# Altium footprint library 声源跟踪小车原封装库.PcbLib: 38 footprints (part 2 of 3)
Each footprint in its own frame and in the unit in brackets; x right, y up, seen from the top. Pads: shape width x height; smd on the part's side, far side on the other; paste and mask are expansions set on the pad; w line width, h text height; cw(c..) or ccw(c..) is an arc to the next point about the centre after c.
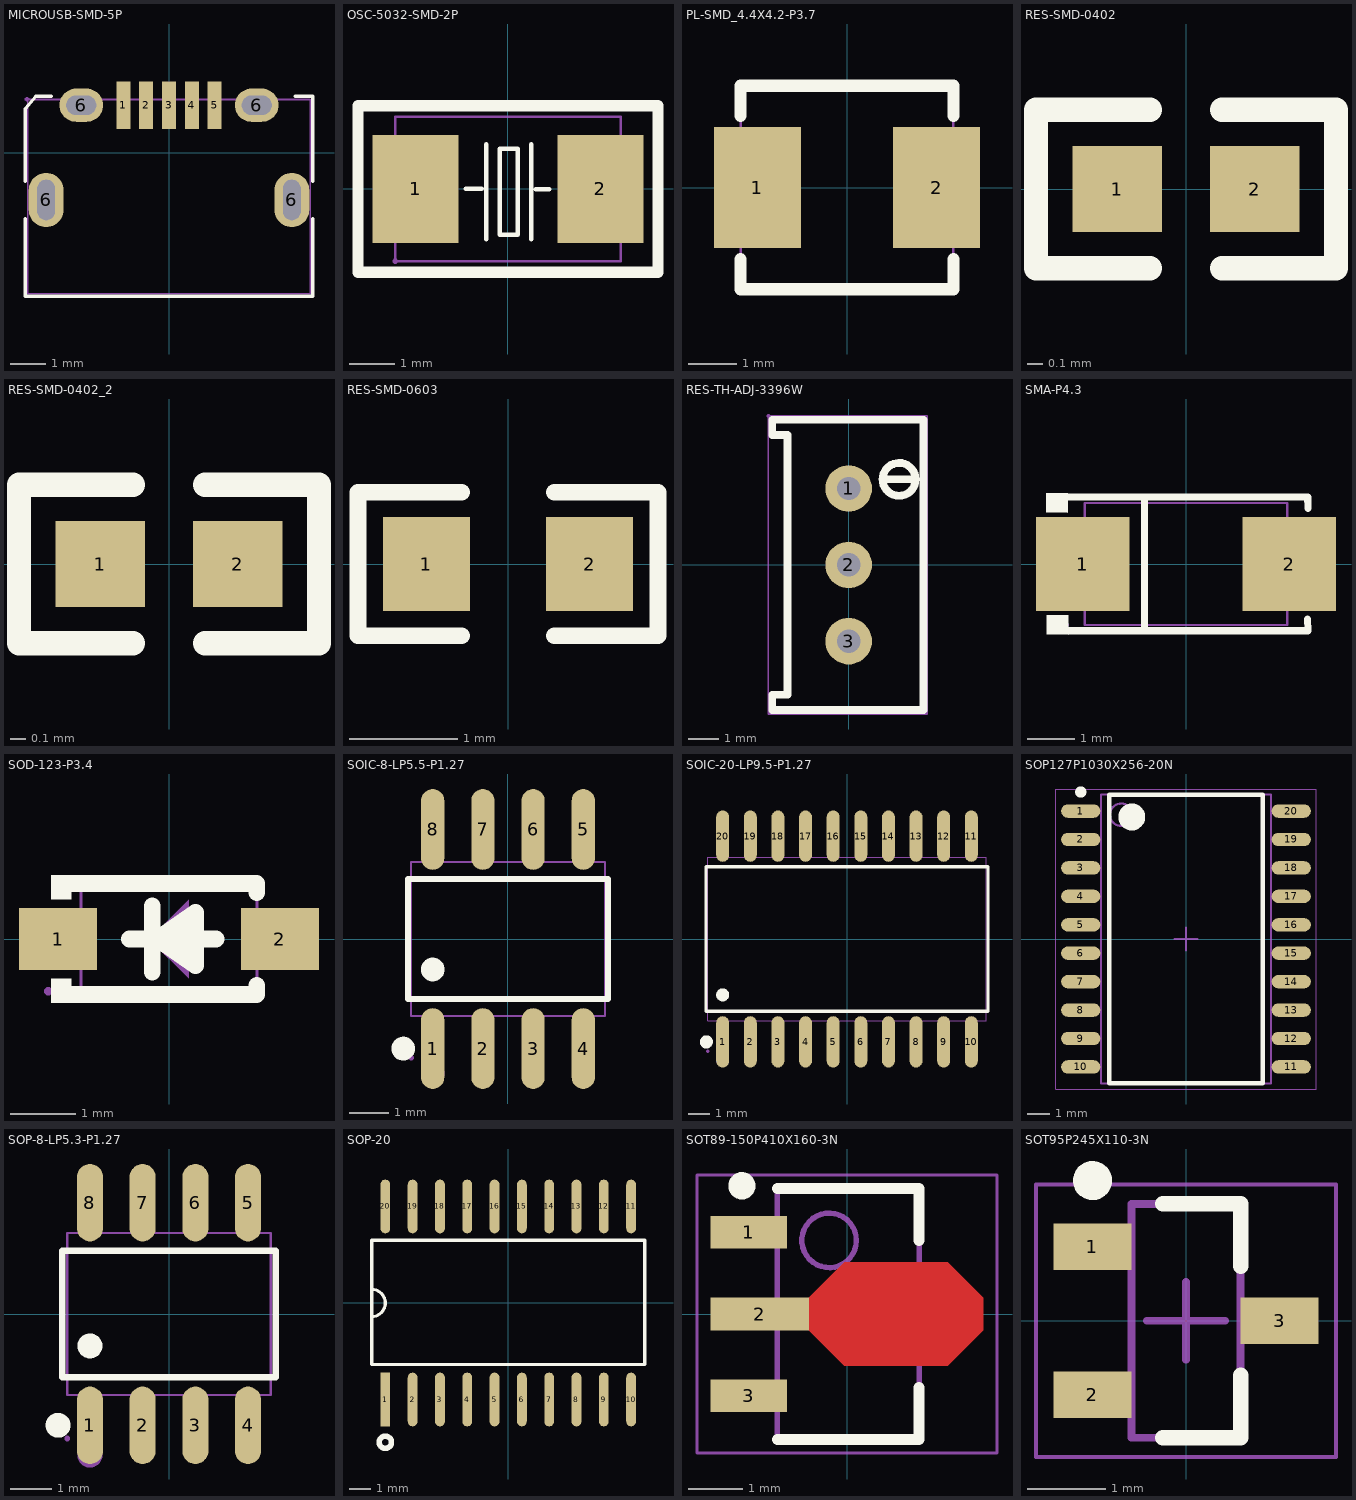
[diagram p1: the footprints below, top view; thin cyan lines are the x and y axes]

## MICROUSB-SMD-5P [mm] "MICRO-USB-5pin"
pads (9):
  rect 0.399x1.351 smd mask+0.051: 1(-1.3,1.35) 2(-0.65,1.35) 3(0,1.35) 4(0.65,1.35) 5(1.3,1.35)
  oval 1.001x1.549 hole 0.5 slot 1.151 at 90 deg mask+0.051: 6(-3.5,-1.35) 6(3.5,-1.35)
  oval 1.25x0.95 hole 0.551 slot 0.851 at 0 deg mask+0.051: 6(-2.499,1.35) 6(2.499,1.35)
Top Overlay:
  lines w0.099: -4.1,-1.883 -4.1,-3.55 -4.1,-4.101 -3.449,-4.101 3.81,-4.101 ; -4.1,-0.819 -4.1,0.951 -4.1,1.251 -3.8,1.599 -3.35,1.599 ; 3.599,1.599 4.1,1.599 4.1,0.9 4.1,-0.819 ; 3.701,-4.101 4.1,-4.101 4.1,-3.499 4.1,-1.883
Mechanical 2:
  region: -3.985,1.523 -3.985,1.548 -4.021,1.584 -4.071,1.584 -4.107,1.548 -4.107,1.523 -4.107,1.497 -4.071,1.462 -4.021,1.462 -3.985,1.497
  lines w0.051: -4.026,-4.022 4.026,-4.022 4.026,1.51 -4.026,1.51 -4.026,-4.022
3D body "Microusb-SMD-5P.step": height 2.73, standoff -0.6, extent -4,-3.893 4,1.637

## OSC-5032-SMD-2P [mm] "OSC-SMD_L5.0-W3.2"
pads (2):
  rect 1.9x2.4 smd mask+0.051: 1(-2.05,0) 2(2.05,0)
Top Overlay:
  lines w0.1: -0.94,0 -0.584,0 ; -0.483,-1.109 -0.483,0.991 ; 0.517,-1.109 0.517,0.991 ; 0.617,-0.009 0.917,-0.009 ; -0.183,-1.009 0.217,-1.009 0.217,0.89 -0.183,0.89 -0.183,-1.009
  lines w0.254: -3.325,-1.85 -3.325,-0.7 -3.325,0.7 -3.325,1.85 3.325,1.85 3.325,0.7 3.325,-0.7 3.325,-1.85 -3.325,-1.85
Mechanical 2:
  region: -2.44,-1.6 -2.44,-1.575 -2.475,-1.54 -2.525,-1.54 -2.56,-1.575 -2.56,-1.6 -2.56,-1.625 -2.525,-1.66 -2.475,-1.66 -2.44,-1.625
  region: -1.2,1 -1.2,-1 -2.5,-1 -2.5,1
  region: 2.5,1 2.5,-1 1.2,-1 1.2,1
  lines w0.051: -2.5,-1.6 2.5,-1.6 2.5,1.6 -2.5,1.6 -2.5,-1.6
3D body "OSC-5032-SMD-2P.step": height 1.42, standoff 0, extent -2.5,-1.6 2.5,1.6

## PL-SMD_4.4X4.2-P3.7 [mm] "IND-SMD_L4.4-W4.2_YXMAA0412"
pads (2):
  rect 1.801x2.499 smd mask+0.051: 1(-1.849,0) 2(1.849,0)
Top Overlay:
  lines w0.254: -2.2,-1.481 -2.2,-2.101 2.2,-2.101 2.2,-1.481 ; -2.2,1.481 -2.2,2.101 2.2,2.101 2.2,1.481
Mechanical 2:
  region: -2.139,-2.101 -2.139,-2.075 -2.174,-2.04 -2.225,-2.04 -2.261,-2.075 -2.261,-2.101 -2.261,-2.126 -2.225,-2.162 -2.174,-2.162 -2.139,-2.126
  region: -2.2,0.749 -1.4,0.749 -1.4,-0.749 -2.2,-0.749
  region: 1.4,0.749 2.2,0.749 2.2,-0.749 1.4,-0.749
  lines w0.051: -2.2,-2.101 -2.2,2.101 2.2,2.101 2.2,-2.101 -2.2,-2.101
3D body "PL-SMD_4.4X4.2-P3.7.step": height 1.21, standoff 0, extent -2.2,-2.101 2.2,2.099

## RES-SMD-0402 [mm] "贴片电阻0402"
pads (2):
  rect 0.566x0.54 smd: 1(-0.433,0) 2(0.433,0)
Top Overlay:
  lines w0.152: -0.226,-0.499 -0.944,-0.499 -0.944,0.499 -0.226,0.499 ; 0.226,-0.499 0.944,-0.499 0.944,0.499 0.226,0.499
Top Paste:
  region: 0.135,-0.23 0.135,0.23 0.175,0.27 0.676,0.27 0.716,0.23 0.716,-0.23 0.676,-0.27 0.175,-0.27
  region: -0.135,-0.23 -0.135,0.23 -0.175,0.27 -0.676,0.27 -0.716,0.23 -0.716,-0.23 -0.676,-0.27 -0.175,-0.27
3D body "RES-SMD-0402.step": height 0.5, standoff 0, extent -0.5,-0.25 0.5,0.25

## RES-SMD-0402_2 [mm]
pads (2):
  rect 0.566x0.54 smd: 1(-0.433,0) 2(0.433,0)
Top Overlay:
  lines w0.152: -0.226,-0.499 -0.944,-0.499 -0.944,0.499 -0.226,0.499 ; 0.226,-0.499 0.944,-0.499 0.944,0.499 0.226,0.499
Top Paste:
  region: 0.135,-0.23 0.135,0.23 0.175,0.27 0.676,0.27 0.716,0.23 0.716,-0.23 0.676,-0.27 0.175,-0.27
  region: -0.135,-0.23 -0.135,0.23 -0.175,0.27 -0.676,0.27 -0.716,0.23 -0.716,-0.23 -0.676,-0.27 -0.175,-0.27
3D body "RES-SMD-0402.step": height 0.5, standoff 0, extent -0.5,-0.25 0.5,0.25

## RES-SMD-0603 [mm] "贴片电阻0603"
pads (2):
  rect 0.806x0.864 smd: 1(-0.753,0) 2(0.753,0)
Top Overlay:
  lines w0.152: -0.426,-0.661 -1.385,-0.661 -1.385,0.661 -0.426,0.661 ; 0.426,-0.661 1.385,-0.661 1.385,0.661 0.426,0.661
Top Paste:
  region: 1.195,0.45 0.395,0.45 0.345,0.4 0.345,0.172 0.715,0.172 0.715,-0.158 0.345,-0.158 0.345,-0.4 0.395,-0.45 1.195,-0.45 1.245,-0.4 1.245,0.4
  region: -0.355,0.4 -0.355,0.172 -0.735,0.172 -0.735,-0.158 -0.355,-0.158 -0.355,-0.4 -0.405,-0.45 -1.195,-0.45 -1.245,-0.4 -1.245,0.4 -1.195,0.45 -0.405,0.45
3D body "RES-SMD-0603.step": height 0.78, standoff -0.02, extent -0.8,-0.4 0.8,0.4

## RES-TH-ADJ-3396W [mil] "RES-ADJ-TH_3P-L10.0-W10.0-P2.50-BL-BS"
pads (3):
  round 60 hole 30 mask+2: 1(0,98.4) 2(0,0) 3(0,-98.4)
Top Overlay:
  lines w10: 50,110.4 65,110.4 ; 86.2,109.99 cw(c64.98,110.19) 86.2,110.4 ; 96.5,-187.2 -96.5,-187.2 -98.4,-187.2 -98.4,-167.5 -78.7,-167.5 -78.7,167.5 -98.4,167.5 -98.4,187 -96.5,187 96.5,187 96.5,-187 ; 65,110.4 80,110.4 65,110.4
Mechanical 1:
  region: -101,192 -101,192.99 -102.41,194.4 -104.39,194.4 -105.8,192.99 -105.8,192 -105.8,191.01 -104.39,189.6 -102.41,189.6 -101,191.01
  region: 11.1,-98.4 11.1,-96.19 9.41,-92.11 6.29,-88.99 2.21,-87.3 -2.21,-87.3 -6.29,-88.99 -9.41,-92.11 -11.1,-96.19 -11.1,-98.4 -11.1,-100.61 -9.41,-104.69 -6.29,-107.81 -2.21,-109.5 2.21,-109.5 6.29,-107.81 9.41,-104.69 11.1,-100.61
  region: 11.1,98.4 11.1,100.61 9.41,104.69 6.29,107.81 2.21,109.5 -2.21,109.5 -6.29,107.81 -9.41,104.69 -11.1,100.61 -11.1,98.4 -11.1,96.19 -9.41,92.11 -6.29,88.99 -2.21,87.3 2.21,87.3 6.29,88.99 9.41,92.11 11.1,96.19
  region: 11.1,0 11.1,2.21 9.41,6.29 6.29,9.41 2.21,11.1 -2.21,11.1 -6.29,9.41 -9.41,6.29 -11.1,2.21 -11.1,0 -11.1,-2.21 -9.41,-6.29 -6.29,-9.41 -2.21,-11.1 2.21,-11.1 6.29,-9.41 9.41,-6.29 11.1,-2.21
  lines w2: -103.4,-192.2 -103.4,192 101.5,192 101.5,-192.2 -103.4,-192.2
3D body "RES-TH-ADJ-3396W.step": height 453.72, standoff -136.81, extent -94.48,-187 96.45,187

## SMA-P4.3 [mm] "SMA_L4.3-W2.6-LS5.1-RD"
pads (2):
  rect 1.999x1.999 smd mask+0.051: 1(-2.2,0) 2(2.2,0)
Top Overlay:
  region: -2.512,-1.095 -2.512,-1.504 -2.972,-1.499 -2.969,-1.095
  region: -2.52,1.504 -2.522,1.095 -2.982,1.1 -2.977,1.504
  lines w0.152: -2.596,-1.425 2.596,-1.425 ; -2.596,1.427 2.596,1.427 2.603,1.186 ; -0.884,-1.425 -0.884,1.427 ; 2.593,-1.176 2.601,-1.415
Mechanical 2:
  region: -1.435,0.724 -1.435,-0.724 -2.56,-0.724 -2.56,0.724
  region: 2.56,0.724 2.56,-0.724 1.435,-0.724 1.435,0.724
  region: -2.499,-1.3 -2.499,-1.275 -2.535,-1.24 -2.586,-1.24 -2.621,-1.275 -2.621,-1.3 -2.621,-1.326 -2.586,-1.361 -2.535,-1.361 -2.499,-1.326
  lines w0.051: -2.159,-1.3 -2.159,1.3 2.159,1.3 2.159,-1.3 -2.159,-1.3
3D body "SMA-P4.3.step": height 2.13, standoff 0.03, extent -2.496,-1.3 2.496,1.3

## SOD-123-P3.4 [mm] "SOD-123_L2.7-W1.6-LS3.7-RD-1"
pads (2):
  rect 1.199x0.95 smd mask+0.051: 1(-1.699,0) 2(1.699,0)
Top Overlay:
  region: 0.406,-0.406 0.406,0.406 -0.178,0
  region: -1.501,0.978 -1.501,0.607 -1.806,0.607 -1.806,0.978
  region: -1.501,-0.978 -1.501,-0.607 -1.806,-0.607 -1.806,-0.978
  lines w0.254: -1.643,0.848 -1.643,0.851 -1.346,0.851 1.346,0.851 1.346,0.706 ; -1.638,-0.848 -1.638,-0.851 -1.346,-0.851 1.346,-0.851 1.346,-0.706 ; -0.61,0 -0.279,0 ; -0.254,-0.508 -0.254,0.508 ; 0.406,0 0.721,0 ; -0.178,0 0.406,0.406 0.406,-0.406 -0.178,0
Mechanical 2:
  region: -1.509,-0.274 -1.509,0.274 -1.341,0.274 -1.341,-0.274
  region: -1.849,-0.274 -1.849,0.274 -1.501,0.274 -1.501,-0.274
  region: 1.341,-0.274 1.341,0.274 1.509,0.274 1.509,-0.274
  region: 1.501,-0.274 1.501,0.274 1.849,0.274 1.849,-0.274
  region: -0.3,0 0.3,-0.599 0.3,0.599
  region: -1.788,-0.8 -1.788,-0.775 -1.824,-0.739 -1.874,-0.739 -1.91,-0.775 -1.91,-0.8 -1.91,-0.825 -1.874,-0.861 -1.824,-0.861 -1.788,-0.825
  lines w0.051: -1.349,-0.8 -1.349,0.8 1.349,0.8 1.349,-0.8 -1.349,-0.8
3D body "SOD-123-P3.4.step": height 1.2, standoff 0, extent -1.85,-0.8 1.85,0.8

## SOIC-8-LP5.5-P1.27 [mil] "SOIC-8_L4.9-W3.9-P1.27-LS6.0-BL"
pads (8):
  oval 23.2x80.5 smd mask+2: 1(-75,-109.1) 2(-25,-109.1) 3(25,-109.1) 4(75,-109.1) 5(75,109.2) 6(25,109.2) 7(-25,109.2) 8(-75,109.2)
Top Overlay:
  circle w11.8: c-104.4,-109.1 r5.9
  circle w11.8: c-75,-30.3 r5.9
  lines w6: -99.5,-59.9 99.5,-59.9 99.5,59.9 -99.5,59.9 -99.5,-59.9
Mechanical 2:
  circle w11.8: c-75,-133.9 r5.9
  region: -94.1,-118.1 -94.1,-117.11 -95.51,-115.7 -97.49,-115.7 -98.9,-117.11 -98.9,-118.1 -98.9,-119.09 -97.49,-120.5 -95.51,-120.5 -94.1,-119.09
  region: 66.7,-118.1 66.7,-85.2 83.3,-85.2 83.3,-118.1
  region: 16.7,-118.1 16.7,-85.2 33.3,-85.2 33.3,-118.1
  region: -33.3,-118.1 -33.3,-85.2 -16.7,-85.2 -16.7,-118.1
  region: -83.3,-118.1 -83.3,-85.2 -66.7,-85.2 -66.7,-118.1
  region: 66.7,-85.6 66.7,-76.4 83.3,-76.4 83.3,-85.6
  region: 16.7,-85.6 16.7,-76.4 33.3,-76.4 33.3,-85.6
  region: -33.3,-85.6 -33.3,-76.4 -16.7,-76.4 -16.7,-85.6
  region: -83.3,-85.6 -83.3,-76.4 -66.7,-76.4 -66.7,-85.6
  region: 66.7,85.6 66.7,76.4 83.3,76.4 83.3,85.6
  region: 16.7,85.6 16.7,76.4 33.3,76.4 33.3,85.6
  region: -33.3,85.6 -33.3,76.4 -16.7,76.4 -16.7,85.6
  region: -83.3,85.6 -83.3,76.4 -66.7,76.4 -66.7,85.6
  region: 66.7,118.1 66.7,85.2 83.3,85.2 83.3,118.1
  region: 16.7,118.1 16.7,85.2 33.3,85.2 33.3,118.1
  region: -33.3,118.1 -33.3,85.2 -16.7,85.2 -16.7,118.1
  region: -83.3,118.1 -83.3,85.2 -66.7,85.2 -66.7,118.1
  lines w2: -96.5,-76.8 96.5,-76.8 96.5,76.8 -96.5,76.8 -96.5,-76.8
3D body "SOIC-8-LP5.5-P1.27.step": height 66.71, standoff -1.01, extent -94.78,-118.11 94.78,118.11

## SOIC-20-LP9.5-P1.27 [mm] "SOIC-20_L13.0-W7.6-P1.27-LS10.3-BL"
pads (20):
  oval 0.594x2.36 smd mask+0.051: 1(-5.715,-4.729) 2(-4.445,-4.729) 3(-3.175,-4.729) 4(-1.905,-4.729) 5(-0.635,-4.729) 6(0.635,-4.729) 7(1.905,-4.729) 8(3.175,-4.729) 9(4.445,-4.729) 10(5.715,-4.729) 11(5.715,4.729) 12(4.445,4.729) 13(3.175,4.729) 14(1.905,4.729) 15(0.635,4.729) 16(-0.635,4.729) 17(-1.905,4.729) 18(-3.175,4.729) 19(-4.445,4.729) 20(-5.715,4.729)
Top Overlay:
  circle w0.3: c-6.464,-4.729 r0.15
  circle w0.3: c-5.715,-2.568 r0.15
  lines w0.152: -6.477,-3.322 6.477,-3.322 6.477,3.322 -6.477,3.322 -6.477,-3.322
Mechanical 2:
  drawing of 46 lines, arcs and shapes, not listed
3D body "SOIC-20-LP9.5-P1.27.step": height 2.82, standoff -0.03, extent -6.4,-5.228 6.4,5.178

## SOP127P1030X256-20N [mm] "SOP, 20-Leads, Body 12.70x7.50mm, Pitch 1.27mm, IPC Medium Density"
height 2.57
pads (20):
  oval 1.75x0.6 smd: 1(-4.7,5.715) 2(-4.7,4.445) 3(-4.7,3.175) 4(-4.7,1.905) 5(-4.7,0.635) 6(-4.7,-0.635) 7(-4.7,-1.905) 8(-4.7,-3.175) 9(-4.7,-4.445) 10(-4.7,-5.715) 11(4.7,-5.715) 12(4.7,-4.445) 13(4.7,-3.175) 14(4.7,-1.905) 15(4.7,-0.635) 16(4.7,0.635) 17(4.7,1.905) 18(4.7,3.175) 19(4.7,4.445) 20(4.7,5.715)
Top Overlay:
  circle w0.25: c-4.7,6.565 r0.125
  circle w0.6: c-2.425,5.45 r0.3
  lines w0.2: -3.425,-6.45 -3.425,6.45 3.425,6.45 3.425,-6.45 -3.425,-6.45
Mechanical 13:
  circle w0.1: c-2.9,5.55 r0.5
  lines w0.1: -3.8,-6.45 -3.8,6.45 3.8,6.45 3.8,-6.45 -3.8,-6.45
Mechanical 15:
  lines w0.05: -5.825,-6.7 -5.825,6.7 5.825,6.7 5.825,-6.7 -5.825,-6.7
  lines w0.1: -0.5,0 0.5,0 ; 0,-0.5 0,0.5
3D body "SOP127P1030X256-20N.step": height 2.57, standoff 0, extent -5.153,-6.45 5.153,6.45

## SOP-8-LP5.3-P1.27 [mm] "SOP-8_L4.9-W3.9-P1.27-LS6.0-BL"
pads (8):
  oval 0.63x1.864 smd mask+0.051: 1(-1.905,-2.682) 2(-0.635,-2.682) 3(0.635,-2.682) 4(1.905,-2.682) 5(1.905,2.682) 6(0.635,2.682) 7(-0.635,2.682) 8(-1.905,2.682)
Top Overlay:
  circle w0.3: c-2.672,-2.682 r0.15
  circle w0.3: c-1.905,-0.77 r0.15
  lines w0.152: -2.576,-1.521 2.576,-1.521 2.576,1.521 -2.576,1.521 -2.576,-1.521
Mechanical 2:
  circle w0.3: c-1.905,-3.401 r0.15
  region: -2.39,-3 -2.39,-2.974 -2.426,-2.939 -2.476,-2.939 -2.512,-2.974 -2.512,-3 -2.512,-3.025 -2.476,-3.061 -2.426,-3.061 -2.39,-3.025
  region: -2.116,-3 -2.116,-2.164 -1.694,-2.164 -1.694,-3
  region: -0.846,-3 -0.846,-2.164 -0.424,-2.164 -0.424,-3
  region: 0.424,-3 0.424,-2.164 0.846,-2.164 0.846,-3
  region: 1.694,-3 1.694,-2.164 2.116,-2.164 2.116,-3
  region: -2.116,-2.174 -2.116,-1.941 -1.694,-1.941 -1.694,-2.174
  region: -0.846,-2.174 -0.846,-1.941 -0.424,-1.941 -0.424,-2.174
  region: 0.424,-2.174 0.424,-1.941 0.846,-1.941 0.846,-2.174
  region: 1.694,-2.174 1.694,-1.941 2.116,-1.941 2.116,-2.174
  region: -2.116,1.941 -2.116,2.174 -1.694,2.174 -1.694,1.941
  region: -0.846,1.941 -0.846,2.174 -0.424,2.174 -0.424,1.941
  region: 0.424,1.941 0.424,2.174 0.846,2.174 0.846,1.941
  region: 1.694,1.941 1.694,2.174 2.116,2.174 2.116,1.941
  region: -2.116,2.164 -2.116,3 -1.694,3 -1.694,2.164
  region: -0.846,2.164 -0.846,3 -0.424,3 -0.424,2.164
  region: 0.424,2.164 0.424,3 0.846,3 0.846,2.164
  region: 1.694,2.164 1.694,3 2.116,3 2.116,2.164
  lines w0.051: -2.451,-1.951 2.451,-1.951 2.451,1.951 -2.451,1.951 -2.451,-1.951
3D body "SOP-8-LP5.3-P1.27.step": height 1.48, standoff -0.03, extent -2.45,-3 2.45,3

## SOP-20 [mm]
pads (20):
  rect 0.456x2.5 smd: 1(-5.715,-4.487)
  oval 0.456x2.5 smd: 2(-4.445,-4.487) 3(-3.175,-4.487) 4(-1.905,-4.487) 5(-0.635,-4.487) 6(0.635,-4.487) 7(1.905,-4.487) 8(3.175,-4.487) 9(4.445,-4.487) 10(5.715,-4.487) 11(5.715,4.488) 12(4.445,4.488) 13(3.175,4.488) 14(1.905,4.488) 15(0.635,4.488) 16(-0.635,4.488) 17(-1.905,4.488) 18(-3.175,4.488) 19(-4.445,4.488) 20(-5.715,4.488)
Top Overlay:
  circle w0.254: c-5.715,-6.477 r0.284
  lines w0.152: -6.35,-2.159 -6.35,0 ; -6.35,-0.635 ccw(c-6.35,0) -6.35,0.635 ; 6.35,-2.159 6.35,0 ; -6.35,-2.859 -6.35,2.921 -0.879,2.921 1.661,2.921 6.35,2.921 6.35,-2.859 -6.35,-2.859

## SOT89-150P410X160-3N [mm] "SOT89, 3-Leads, Body 4.50x2.45mm, Pitch 1.50mm, Lead Span 4.1mm, IPC Medium Density"
height 1.6
pads (3):
  rect 1.4x0.6 smd: 1(-1.8,1.5) 3(-1.8,-1.5)
  rect 1.8x0.6 smd: 2(-1.6,0)
Top Layer:
  region: -0.7,0.3 -0.05,0.95 1.85,0.95 2.5,0.3 2.5,-0.3 1.85,-0.95 -0.05,-0.95 -0.7,-0.3
Top Overlay:
  circle w0.25: c-1.927,2.35 r0.125
  lines w0.2: -1.278,-2.3 1.322,-2.3 1.322,-1.35 ; -1.278,2.3 1.322,2.3 1.322,1.35
Mechanical 13:
  circle w0.1: c-0.327,1.35 r0.5
  lines w0.1: -1.278,-2.3 -1.278,2.3 1.322,2.3 1.322,-2.3 -1.278,-2.3
Mechanical 15:
  lines w0.05: -2.75,-2.55 -2.75,2.55 2.75,2.55 2.75,-2.55 -2.75,-2.55
  lines w0.1: -0.477,0 0.523,0 ; 0.022,-0.5 0.022,0.5
3D body: height 1.6, standoff 0, extent -1.278,-2.3 1.322,2.3

## SOT95P245X110-3N [mm] "SOT23, 3-Leads, Body 2.90x2.45mm, Pitch 0.95mm, IPC Medium Density"
height 1.1
pads (3):
  rect 1x0.6 smd: 1(-1.2,0.95) 2(-1.2,-0.95) 3(1.2,0)
Top Overlay:
  circle w0.25: c-1.2,1.8 r0.125
  lines w0.2: -0.3,-1.5 0.7,-1.5 0.7,-0.7 ; -0.3,1.5 0.7,1.5 0.7,0.7
Mechanical 13:
  lines w0.1: -0.7,-1.5 0.7,-1.5 0.7,1.5 -0.7,1.5 -0.7,-1.5
Mechanical 15:
  lines w0.05: -1.925,-1.75 1.925,-1.75 1.925,1.75 -1.925,1.75 -1.925,-1.75
  lines w0.1: -0.5,0 0.5,0 ; 0,-0.5 0,0.5
3D body: height 1.1, standoff 0.05, extent -0.7,-1.5 0.7,1.5